# Altium footprint library Standard2.PcbLib: 423 footprints (part 17 of 27)
Each footprint in its own frame and in the unit in brackets; x right, y up, seen from the top. Pads: shape width x height; smd on the part's side, far side on the other; paste and mask are expansions set on the pad; w line width, h text height; cw(c..) or ccw(c..) is an arc to the next point about the centre after c.
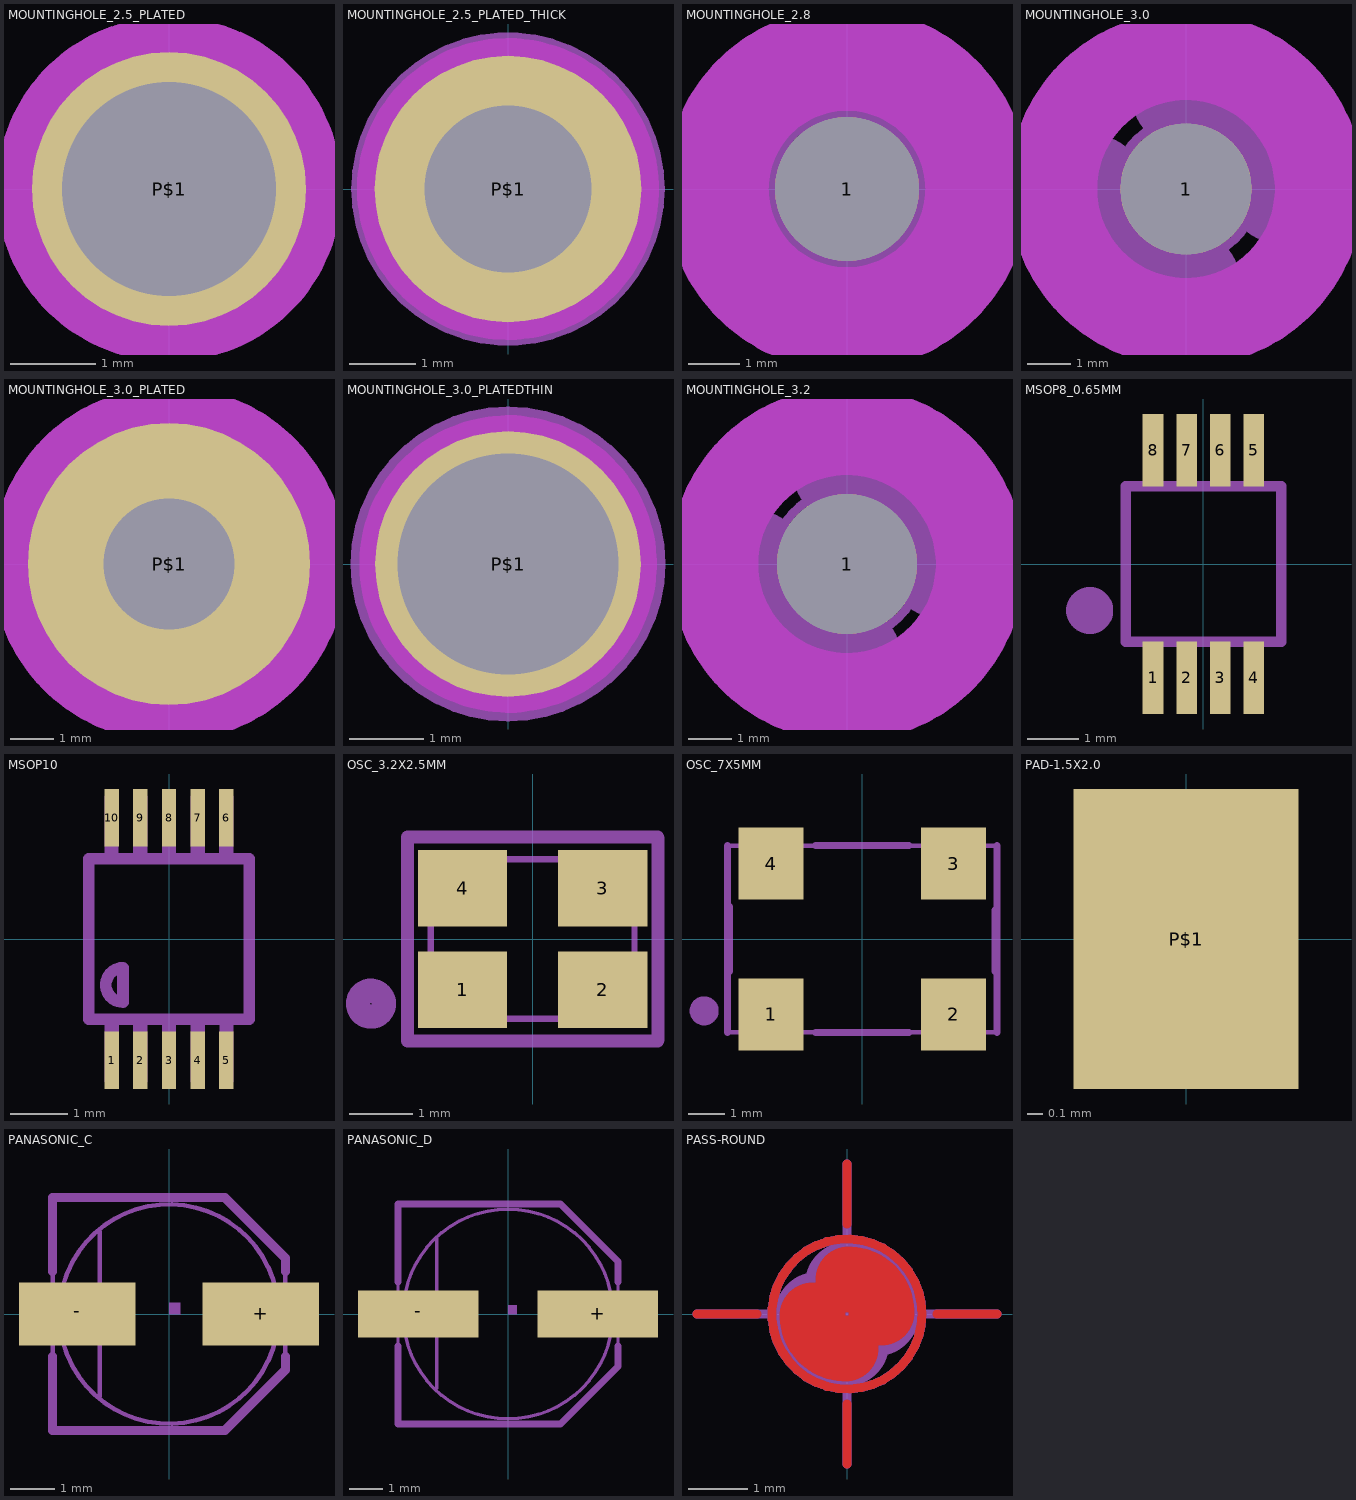
[diagram p16: the footprints below, top view; thin cyan lines are the x and y axes]

## MOUNTINGHOLE_2.5_PLATED [mm]
pads (1):
  round 3.2 hole 2.5: P$1(0,0)
Keep-Out Layer:
  circle w2.032: c0,0 r1
  circle w2.032: c0,0 r1
Mechanical 2:
  circle w0.203: c0,0 r1.75
Mechanical 10 keep-out:
  circle w2.032: c0,0 r1
Mechanical 11 keep-out:
  circle w2.032: c0,0 r1

## MOUNTINGHOLE_2.5_PLATED_THICK [mm]
pads (1):
  round 4 hole 2.5: P$1(0,0)
Keep-Out Layer:
  circle w2.032: c0,0 r1.25
  circle w2.032: c0,0 r1.25
Mechanical 2:
  circle w0.203: c0,0 r2.25
Mechanical 10 keep-out:
  circle w2.032: c0,0 r1.25
Mechanical 11 keep-out:
  circle w2.032: c0,0 r1.25

## MOUNTINGHOLE_2.8 [mm]
pads (1):
  round 2.8 hole 2.8: 1(0,0)
Keep-Out Layer:
  circle w2.032: c0,0 r2.54
  circle w2.032: c0,0 r2.54
Mechanical 2:
  circle w0.203: c0,0 r2.921
  circle w0.203: c0,0 r1.5
Mechanical 10 keep-out:
  circle w2.032: c0,0 r2.54
Mechanical 11 keep-out:
  circle w2.032: c0,0 r2.54
Mechanical 12:
  circle w2.032: c0,0 r2.54
Mechanical 18:
  circle w0.457: c0,0 r0.635
  lines w2.286: -1.778,0 ccw(c0,0) 0,-1.778 ; 0,1.778 cw(c0,0) 1.778,0

## MOUNTINGHOLE_3.0 [mm]
pads (1):
  round 3 hole 3: 1(0,0)
Keep-Out Layer:
  circle w2.032: c0,0 r3.048
  circle w2.032: c0,0 r3.048
Mechanical 2:
  circle w0.203: c0,0 r3.429
  circle w0.203: c0,0 r1.6
Mechanical 10 keep-out:
  circle w2.032: c0,0 r3.048
Mechanical 11 keep-out:
  circle w2.032: c0,0 r3.048
Mechanical 12:
  circle w2.032: c0,0 r3.048
Mechanical 18:
  circle w0.457: c0,0 r0.762
  lines w2.489: -2.159,0 ccw(c0,0) 0,-2.159 ; 0,2.159 cw(c0,0) 2.159,0

## MOUNTINGHOLE_3.0_PLATED [mil]
pads (1):
  round 254 hole 118.11: P$1(0,0)
Keep-Out Layer:
  circle w80: c0,0 r120
  circle w80: c0,0 r120
Mechanical 2:
  circle w8: c0,0 r135
Mechanical 10 keep-out:
  circle w80: c0,0 r120
Mechanical 11 keep-out:
  circle w80: c0,0 r120
Mechanical 12:
  circle w80: c0,0 r120
Mechanical 18:
  circle w18: c0,0 r30
  lines w98: -85,0 ccw(c0,0) 0,-85 ; 0,85 cw(c0,0) 85,0

## MOUNTINGHOLE_3.0_PLATEDTHIN [mm]
pads (1):
  round 3.6 hole 3: P$1(0,0)
Keep-Out Layer:
  circle w2.032: c0,0 r1
  circle w2.032: c0,0 r1
Mechanical 2:
  circle w0.203: c0,0 r2.032
Mechanical 10 keep-out:
  circle w2.032: c0,0 r1
Mechanical 11 keep-out:
  circle w2.032: c0,0 r1
Mechanical 12:
  circle w2.032: c0,0 r1

## MOUNTINGHOLE_3.2 [mm]
pads (1):
  round 3.2 hole 3.2: 1(0,0)
Keep-Out Layer:
  circle w2.032: c0,0 r3.048
  circle w2.032: c0,0 r3.048
Mechanical 2:
  circle w0.203: c0,0 r3.429
  circle w0.203: c0,0 r1.7
Mechanical 10 keep-out:
  circle w2.032: c0,0 r3.048
Mechanical 11 keep-out:
  circle w2.032: c0,0 r3.048
Mechanical 12:
  circle w2.032: c0,0 r3.048
Mechanical 18:
  circle w0.457: c0,0 r0.762
  lines w2.489: -2.159,0 ccw(c0,0) 0,-2.159 ; 0,2.159 cw(c0,0) 2.159,0

## MSOP8_0.65MM [mm]
pads (8):
  rect 0.4x1.4 smd: 1(-0.975,-2.2) 2(-0.325,-2.2) 3(0.325,-2.2) 4(0.975,-2.2) 5(0.975,2.2) 6(0.325,2.2) 7(-0.325,2.2) 8(-0.975,2.2)
Mechanical 2:
  circle w0.61: c-2.2,-0.9 r0.15
  lines w0.203: -1.5,-1.5 -1.5,1.5 ; 1.5,-1.5 1.5,1.5
Mechanical 18:
  lines w0.127: -1.5,-1.5 -1.5,1.5 ; 1.5,-1.5 1.5,1.5
  lines w0.203: -1.5,-1.5 1.5,-1.5 ; -1.5,1.5 1.5,1.5

## MSOP10 [mm]
pads (10):
  rect 0.25x1 smd: 1(-1,-2.113) 2(-0.5,-2.113) 3(0,-2.113) 4(0.5,-2.113) 5(1,-2.113) 6(1,2.113) 7(0.5,2.113) 8(0,2.113) 9(-0.5,2.113) 10(-1,2.113)
Mechanical 2:
  lines w0.203: -1.4,-1.4 1.4,-1.4 1.4,1.4 -1.4,1.4 -1.4,-1.4 ; -0.8,-1.1 cw(c-0.8,-0.8) -0.8,-0.5 -0.8,-1.1
Mechanical 18:
  rectangle: -1.124,-2.5 -0.875,-1.5
  rectangle: -0.624,-2.5 -0.374,-1.5
  rectangle: -0.124,-2.5 0.125,-1.5
  rectangle: 0.376,-2.5 0.626,-1.5
  rectangle: 0.876,-2.5 1.126,-1.5
  region: 1.124,2.5 0.875,2.5 0.875,1.5 1.124,1.5
  region: 0.624,2.5 0.374,2.5 0.374,1.5 0.624,1.5
  region: 0.124,2.5 -0.125,2.5 -0.125,1.5 0.124,1.5
  region: -0.376,2.5 -0.626,2.5 -0.626,1.5 -0.376,1.5
  region: -0.876,2.5 -1.126,2.5 -1.126,1.5 -0.876,1.5

## OSC_3.2X2.5MM [mil]
pads (4):
  rect 55.12x47.24 smd: 1(-43.31,-31.5) 2(43.31,-31.5) 3(43.31,31.5) 4(-43.31,31.5)
Mechanical 2:
  circle w15: c-100,-40 r8
  lines w8: -77.5,-62.5 -77.5,62.5 ; -77.34,-63.15 77.34,-63.15 ; -77.34,63.15 77.34,63.15 ; 77.5,-62.5 77.5,62.5
Mechanical 18:
  lines w3.94: -62.99,-41.34 cw(c-59.05,-45.27) -55.12,-49.21 55.12,-49.21 cw(c59.05,-45.27) 62.99,-41.34 62.99,41.34 cw(c59.05,45.27) 55.12,49.21 -55.12,49.21 cw(c-59.05,45.27) -62.99,41.34 -62.99,-41.34

## OSC_7X5MM [mm]
pads (4):
  rect 1.8x2 smd: 1(-2.54,-2.1) 2(2.54,-2.1) 3(2.54,2.1) 4(-2.54,2.1)
Mechanical 2:
  circle w0.406: c-4.4,-2 r0.2
  lines w0.203: -3.7,-0.9 -3.7,0.9 ; -1.3,-2.6 1.3,-2.6 ; -1.3,2.6 1.3,2.6 ; 3.7,-0.9 3.7,0.8
Mechanical 18:
  lines w0.127: -3.75,-2.6 3.75,-2.6 ; -3.75,2.6 3.75,2.6
  lines w0.203: -3.75,-2.6 -3.75,2.6 ; 3.75,-2.6 3.75,2.6

## PAD-1.5X2.0 [mm]
pads (1):
  rect 1.5x2 smd paste-1: P$1(0,0)

## PANASONIC_C [mm]
pads (2):
  rect 2.6x1.4 smd: +(2.05,0) -(-2.05,0)
Mechanical 2:
  lines w0.203: -2.6,-0.95 -2.6,-2.6 1.25,-2.6 2.6,-1.25 2.6,-0.95 ; -2.6,0.95 -2.6,2.6 1.25,2.6 2.6,1.25 2.6,0.95
Mechanical 18:
  circle w0.102: c0,0 r2.45
  rectangle: -2.95,-0.35 -2.4,0.35
  rectangle: 2.4,-0.35 2.95,0.35
  region: 0,0 0.254,0 0.254,0.254 0,0.254
  lines w0.102: -1.55,-1.85 -1.55,1.85 ; -2.6,-2.6 1.25,-2.6 2.6,-1.25 2.6,1.25 1.25,2.6 -2.6,2.6 -2.6,-2.6

## PANASONIC_D [mil]
pads (2):
  rect 140x55.12 smd: +(104.49,0) -(-104.49,0)
Mechanical 2:
  lines w8: -127.95,-37.4 -127.95,-127.95 61.02,-127.95 127.95,-61.02 127.95,-37.4 ; -127.95,37.4 -127.95,127.95 61.02,127.95 127.95,61.02 127.95,37.4
Mechanical 18:
  circle w4: c0,0 r122.05
  rectangle: -143.7,-13.78 -120.08,13.78
  rectangle: 120.08,-13.78 143.7,13.78
  region: 0,0 10,0 10,10 0,10
  lines w4: -82.68,-86.61 -82.68,88.58 ; -127.95,-127.95 61.02,-127.95 127.95,-61.02 127.95,61.02 61.02,127.95 -127.95,127.95 -127.95,-127.95

## PASS-ROUND [mm]
Top Layer:
  circle w0.152: c0,0 r1.27
  lines w0.152: -2.54,0 -1.524,0 ; 0,-2.54 0,-1.524 ; 0,1.524 0,2.54 ; 1.524,0 2.54,0
  lines w1.118: -0.584,-0.025 ccw(c-0.025,-0.025) -0.025,-0.584 ; 0.025,0.584 cw(c0.025,0.025) 0.584,0.025
Bottom Layer:
  circle w0.152: c0,0 r1.27
  lines w0.152: -2.54,0 -1.524,0 ; 0,-2.54 0,-1.524 ; 0,1.524 0,2.54 ; 1.524,0 2.54,0
  lines w1.118: -0.584,-0.025 ccw(c-0.025,-0.025) -0.025,-0.584 ; 0.025,0.584 cw(c0.025,0.025) 0.584,0.025
Top Solder:
  circle w0: c0,0 r2.54
Bottom Solder:
  circle w0: c0,0 r2.54
Mechanical 16:
  circle w0.152: c0,0 r1.27
  circle w0.152: c0,0 r1.27
  lines w0.152: -2.54,0 -1.27,0 ; 0,-2.54 0,-1.27 ; 0,1.27 0,2.54 ; 1.27,0 2.54,0
  lines w1.422: -0.508,0 ccw(c0,0) 0,-0.508 cw(c0,0) -0.508,0 ; 0,0.508 cw(c0,0) 0.508,0 ccw(c0,0) 0,0.508

## PCBComponent_1 [mm]